# Altium footprint library Connektor.PcbLib: 305 footprints (part 13 of 20)
Each footprint in its own frame and in the unit in brackets; x right, y up, seen from the top. Pads: shape width x height; smd on the part's side, far side on the other; paste and mask are expansions set on the pad; w line width, h text height; cw(c..) or ccw(c..) is an arc to the next point about the centre after c.
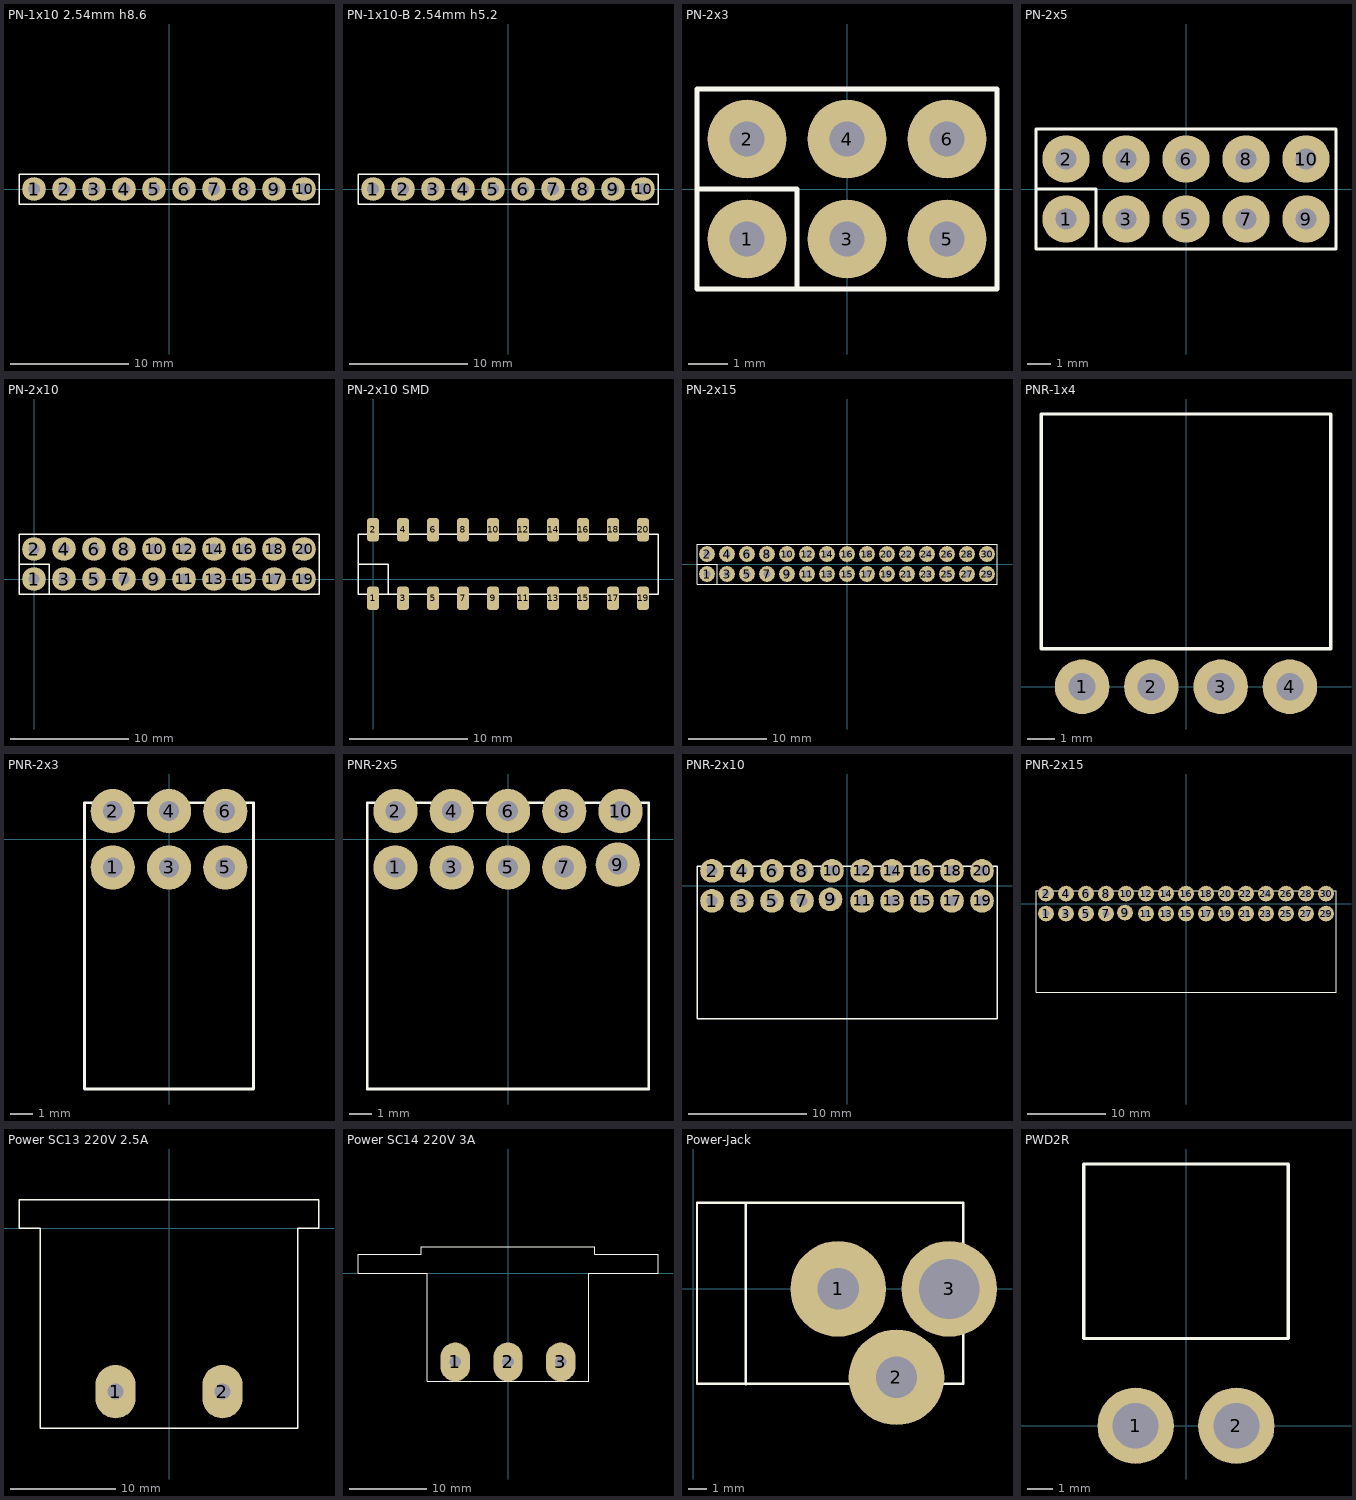
[diagram p12: the footprints below, top view; thin cyan lines are the x and y axes]

## PN-1x10 2.54mm h8.6 [mm]
pads (10):
  round 2 hole 1: 1(-11.43,0) 2(-8.89,0) 3(-6.35,0) 4(-3.81,0) 5(-1.27,0) 6(1.27,0) 7(3.81,0) 8(6.35,0) 9(8.89,0) 10(11.43,0)
TopOverlay:
  lines w0.127: -12.7,-1.27 -12.7,1.27 12.7,1.27 12.7,-1.27 -12.7,-1.27
3D body: height 8.5, standoff -3, extent -12.7,-1.27 12.7,1.27

## PN-1x10-B 2.54mm h5.2 [mm]
pads (10):
  round 2 hole 1: 1(-11.43,0) 2(-8.89,0) 3(-6.35,0) 4(-3.81,0) 5(-1.27,0) 6(1.27,0) 7(3.81,0) 8(6.35,0) 9(8.89,0) 10(11.43,0)
TopOverlay:
  lines w0.127: -12.7,-1.27 -12.7,1.27 12.7,1.27 12.7,-1.27 -12.7,-1.27
3D body: height 5.2, standoff -2.5, extent -12.7,-1.27 12.7,1.27

## PN-2x3 [mm]
pads (6):
  round 2 hole 0.9: 1(-2.54,-1.27) 2(-2.54,1.27) 3(0,-1.27) 4(0,1.27) 5(2.54,-1.27) 6(2.54,1.27)
TopOverlay:
  lines w0.127: -3.81,0 -1.27,0 -1.27,-2.54 ; -3.81,-2.54 3.81,-2.54 3.81,2.54 -3.81,2.54 -3.81,-2.54
3D body: height 8.5, standoff -3, extent -3.81,-2.54 3.81,2.54

## PN-2x5 [mm]
pads (10):
  round 2 hole 0.9: 1(-5.08,-1.27) 2(-5.08,1.27) 3(-2.54,-1.27) 4(-2.54,1.27) 5(0,-1.27) 6(0,1.27) 7(2.54,-1.27) 8(2.54,1.27) 9(5.08,-1.27) 10(5.08,1.27)
TopOverlay:
  lines w0.127: -6.35,0 -3.81,0 -3.81,-2.54 ; -6.35,-2.54 -6.35,2.54 6.35,2.54 6.35,-2.54 -6.35,-2.54
3D body: height 8.5, standoff -3, extent -6.35,-2.54 6.35,2.54

## PN-2x10 [mm]
pads (20):
  round 2 hole 0.9: 1(0,0) 2(0,2.54) 3(2.54,0) 4(2.54,2.54) 5(5.08,0) 6(5.08,2.54) 7(7.62,0) 8(7.62,2.54) 9(10.16,0) 10(10.16,2.54) 11(12.7,0) 12(12.7,2.54) 13(15.24,0) 14(15.24,2.54) 15(17.78,0) 16(17.78,2.54) 17(20.32,0) 18(20.32,2.54) 19(22.86,0) 20(22.86,2.54)
TopOverlay:
  lines w0.127: -1.27,1.27 1.27,1.27 1.27,-1.27 ; -1.27,-1.27 24.13,-1.27 24.13,3.81 -1.27,3.81 -1.27,-1.27
3D body: height 8.5, standoff -3, extent -1.27,-1.27 24.13,3.81

## PN-2x10 SMD [mm]
pads (20):
  rrect50% 1x2 smd: 1(0,-1.63) 2(0,4.17) 3(2.54,-1.63) 4(2.54,4.17) 5(5.08,-1.63) 6(5.08,4.17) 7(7.62,-1.63) 8(7.62,4.17) 9(10.16,-1.63) 10(10.16,4.17) 11(12.7,-1.63) 12(12.7,4.17) 13(15.24,-1.63) 14(15.24,4.17) 15(17.78,-1.63) 16(17.78,4.17) 17(20.32,-1.63) 18(20.32,4.17) 19(22.86,-1.63) 20(22.86,4.17)
TopOverlay:
  lines w0.127: -1.27,1.27 1.27,1.27 1.27,-1.27 ; -1.27,-1.27 24.13,-1.27 24.13,3.81 -1.27,3.81 -1.27,-1.27
3D body: height 8.5, standoff -3, extent -1.27,-1.27 24.13,3.81

## PN-2x15 [mm]
pads (30):
  round 2 hole 0.9: 1(-17.78,-1.27) 2(-17.78,1.27) 3(-15.24,-1.27) 4(-15.24,1.27) 5(-12.7,-1.27) 6(-12.7,1.27) 7(-10.16,-1.27) 8(-10.16,1.27) 9(-7.62,-1.27) 10(-7.62,1.27) 11(-5.08,-1.27) 12(-5.08,1.27) 13(-2.54,-1.27) 14(-2.54,1.27) 15(0,-1.27) 16(0,1.27) 17(2.54,-1.27) 18(2.54,1.27) 19(5.08,-1.27) 20(5.08,1.27) 21(7.62,-1.27) 22(7.62,1.27) 23(10.16,-1.27) 24(10.16,1.27) 25(12.7,-1.27) 26(12.7,1.27) 27(15.24,-1.27) 28(15.24,1.27) 29(17.78,-1.27) 30(17.78,1.27)
TopOverlay:
  lines w0.127: -19.05,0 -16.51,0 -16.51,-2.54 ; -19.05,-2.54 19.05,-2.54 19.05,2.54 -19.05,2.54 -19.05,-2.54
3D body: height 8.5, standoff -3, extent -19.05,-2.54 19.05,2.54

## PNR-1x4 [mm]
pads (4):
  round 2 hole 1: 1(-3.81,0) 2(-1.27,0) 3(1.27,0) 4(3.81,0)
TopOverlay:
  lines w0.127: -5.3,1.4 -5.3,10 5.3,10 5.3,1.4 -5.3,1.4
3D body: height 2.54, standoff -1.23, extent -5.31,-0.25 5.31,10

## PNR-2x3 [mm]
pads (6):
  round 2 hole 0.9: 1(-2.54,-1.27) 2(-2.54,1.27) 3(0,-1.27) 4(0,1.27) 5(2.54,-1.27) 6(2.54,1.27)
TopOverlay:
  lines w0.127: -3.81,-11.27 -3.81,1.651 3.81,1.651 3.81,-11.27 -3.81,-11.27
3D body: height 5, standoff -2.5, extent -3.81,-11.27 3.81,1.58

## PNR-2x5 [mm]
pads (10):
  round 2 hole 0.9: 1(-5.08,-1.27) 2(-5.08,1.27) 3(-2.54,-1.27) 4(-2.54,1.27) 5(0,-1.27) 6(0,1.27) 7(2.54,-1.27) 8(2.54,1.27) 9(4.953,-1.143) 10(5.08,1.27)
TopOverlay:
  lines w0.127: -6.35,-11.27 -6.35,1.651 6.35,1.651 6.35,-11.27 -6.35,-11.27
3D body: height 5, standoff -2.5, extent -6.35,-11.27 6.35,1.58

## PNR-2x10 [mm]
pads (20):
  round 2 hole 0.9: 1(-11.43,-1.27) 2(-11.43,1.27) 3(-8.89,-1.27) 4(-8.89,1.27) 5(-6.35,-1.27) 6(-6.35,1.27) 7(-3.81,-1.27) 8(-3.81,1.27) 9(-1.397,-1.143) 10(-1.27,1.27) 11(1.27,-1.27) 12(1.27,1.27) 13(3.81,-1.27) 14(3.81,1.27) 15(6.35,-1.27) 16(6.35,1.27) 17(8.89,-1.27) 18(8.89,1.27) 19(11.43,-1.27) 20(11.43,1.27)
TopOverlay:
  lines w0.127: -12.7,-11.27 -12.7,1.651 12.7,1.651 12.7,-11.27 -12.7,-11.27
3D body: height 5, standoff -2.5, extent -12.7,-11.27 12.7,1.58

## PNR-2x15 [mm]
pads (30):
  round 2 hole 0.9: 1(-17.78,-1.27) 2(-17.78,1.27) 3(-15.24,-1.27) 4(-15.24,1.27) 5(-12.7,-1.27) 6(-12.7,1.27) 7(-10.16,-1.27) 8(-10.16,1.27) 9(-7.747,-1.143) 10(-7.62,1.27) 11(-5.08,-1.27) 12(-5.08,1.27) 13(-2.54,-1.27) 14(-2.54,1.27) 15(0,-1.27) 16(0,1.27) 17(2.54,-1.27) 18(2.54,1.27) 19(5.08,-1.27) 20(5.08,1.27) 21(7.62,-1.27) 22(7.62,1.27) 23(10.16,-1.27) 24(10.16,1.27) 25(12.7,-1.27) 26(12.7,1.27) 27(15.24,-1.27) 28(15.24,1.27) 29(17.78,-1.27) 30(17.78,1.27)
TopOverlay:
  lines w0.127: -19.05,-11.27 -19.05,1.651 19.05,1.651 19.05,-11.27 -19.05,-11.27
3D body: height 5, standoff -2.5, extent -19.05,-11.27 19.05,1.58

## Power SC13 220V 2.5A [mm]
pads (2):
  oval 3.81x5.08 hole 1.5: 1(-5.08,-15.5) 2(5.08,-15.5)
TopOverlay:
  lines w0.127: -14.25,0 -12.25,0 -12.25,-19 12.25,-19 12.25,0 14.25,0 14.25,2.75 -14.25,2.75 -14.25,0
3D body: height 14, standoff -2, extent -14.1,-19.2 14.1,2.5

## Power SC14 220V 3A [mm]
pads (3):
  oval 3.81x5.08 hole 1.5: 1(-6.86,-11.5) 2(0,-11.5) 3(6.86,-11.5)
TopOverlay:
  lines w0.127: -19.5,0 -10.5,0 -10.5,-14 10.5,-14 10.5,0 19.5,0 19.5,2.5 11.25,2.5 11.25,3.5 -11.25,3.5 -11.25,2.5 -19.5,2.5 -19.5,0
3D body: height 16.25, standoff -3.5, extent -19.5,-14 19.5,3.5

## Power-Jack [mm]
pads (3):
  round 5.08 hole 2.2: 1(7.7,0) 2(10.8,-4.7)
  round 5.08 hole 3.2: 3(13.6,0)
TopOverlay:
  lines w0.127: 2.794,-5.08 2.794,4.572 ; 0.2,-5.033 0.2,4.572 14.35,4.572 14.35,-5.033 0.2,-5.033
3D body: height 11.05, standoff -4, extent 0.2,-5.033 14.35,4.55

## PWD2R [mm]
pads (2):
  round 3 hole 1.8: 1(-1.98,0) 2(1.98,0)
TopOverlay:
  lines w0.127: -4.02,3.429 -4.02,10.287 4.02,10.287 4.02,3.429 -4.02,3.429